# Altium footprint library IC.PcbLib: 68 footprints (part 2 of 5)
Each footprint in its own frame and in the unit in brackets; x right, y up, seen from the top. Pads: shape width x height; smd on the part's side, far side on the other; paste and mask are expansions set on the pad; w line width, h text height; cw(c..) or ccw(c..) is an arc to the next point about the centre after c.
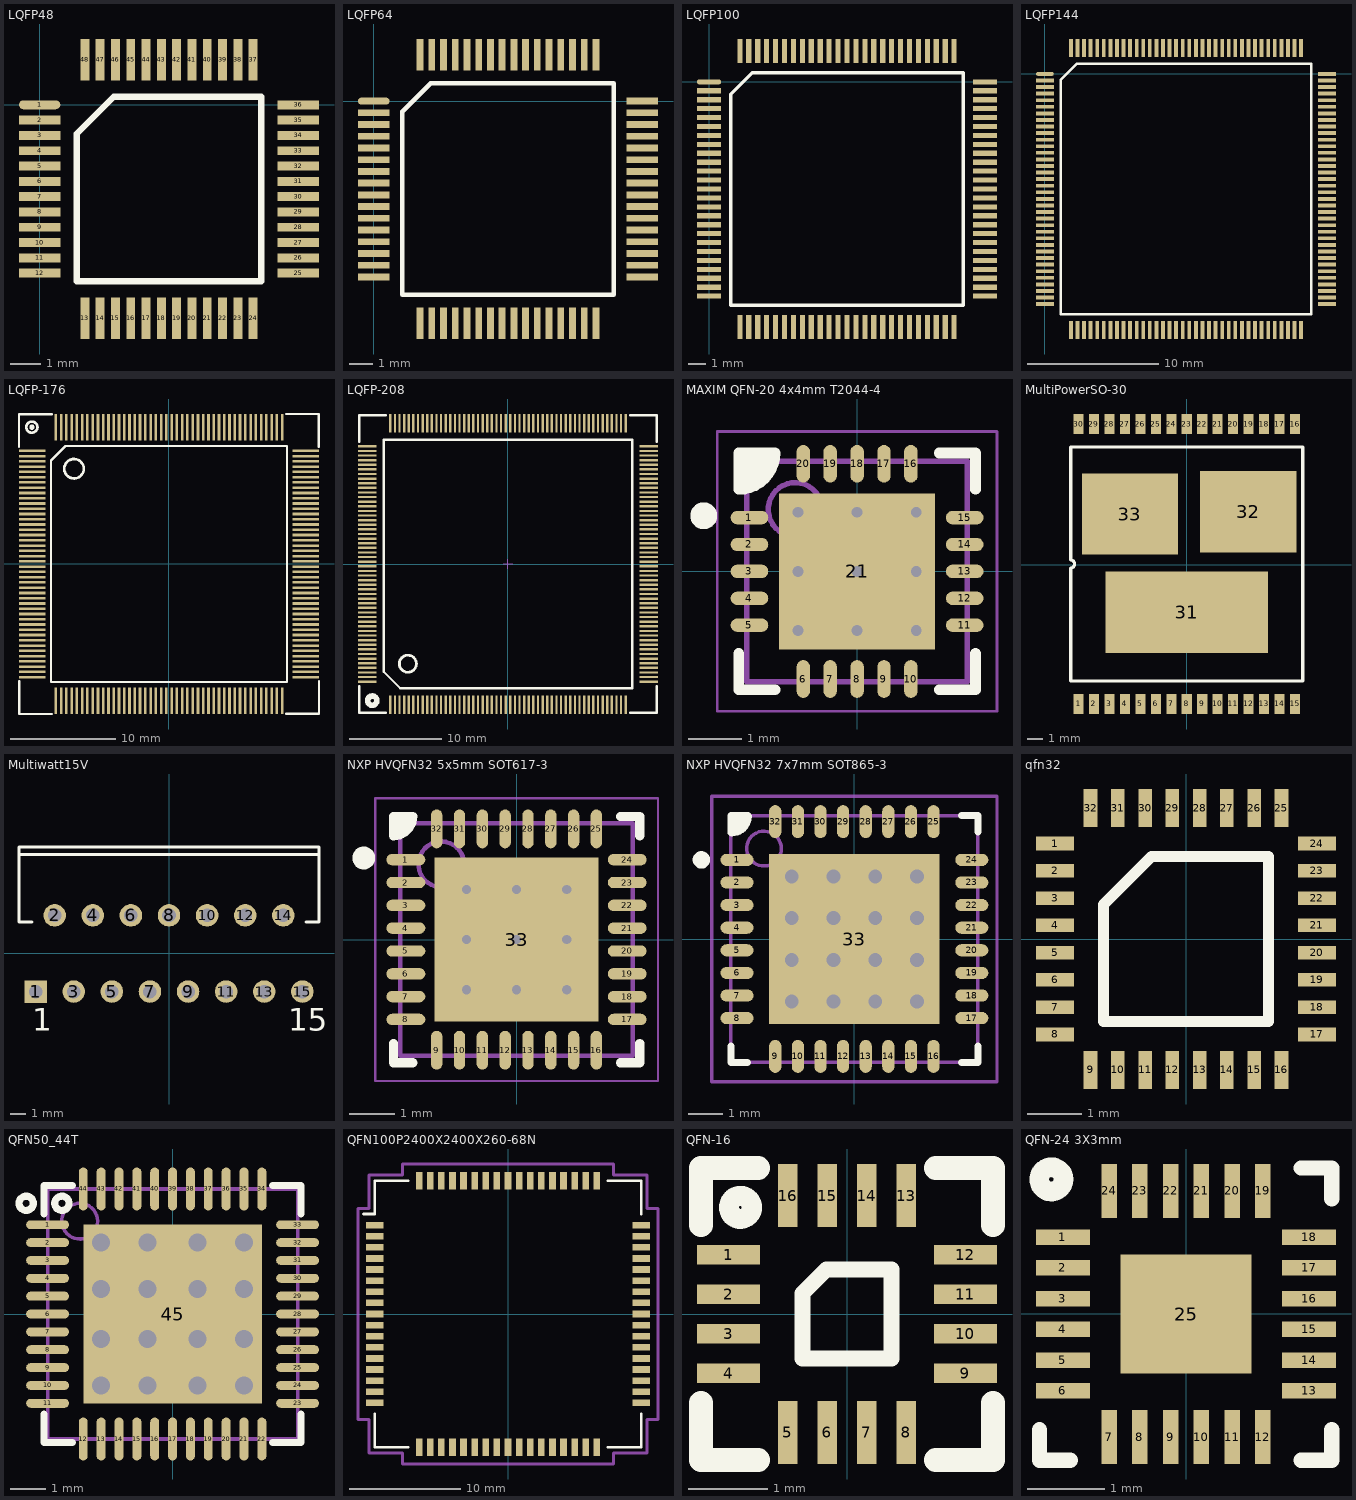
[diagram p1: the footprints below, top view; thin cyan lines are the x and y axes]

## LQFP48 [mm]
pads (48):
  oval 1.35x0.29 smd: 1(0,0)
  rect 1.35x0.29 smd: 2(0,-0.5) 3(0,-1) 4(0,-1.5) 5(0,-2) 6(0,-2.5) 7(0,-3) 8(0,-3.5) 9(0,-4) 10(0,-4.5) 11(0,-5) 12(0,-5.5) 25(8.45,-5.5) 26(8.45,-5) 27(8.45,-4.5) 28(8.45,-4) 29(8.45,-3.5) 30(8.45,-3) 31(8.45,-2.5) 32(8.45,-2) 33(8.45,-1.5) 34(8.45,-1) 35(8.45,-0.5) 36(8.45,0)
  rect 0.29x1.35 smd: 13(1.475,-6.975) 14(1.975,-6.975) 15(2.475,-6.975) 16(2.975,-6.975) 17(3.475,-6.975) 18(3.975,-6.975) 19(4.475,-6.975) 20(4.975,-6.975) 21(5.475,-6.975) 22(5.975,-6.975) 23(6.475,-6.975) 24(6.975,-6.975) 37(6.975,1.475) 38(6.475,1.475) 39(5.975,1.475) 40(5.475,1.475) 41(4.975,1.475) 42(4.475,1.475) 43(3.975,1.475) 44(3.475,1.475) 45(2.975,1.475) 46(2.475,1.475) 47(1.975,1.475) 48(1.475,1.475)
Top Overlay:
  lines w0.2: 1.21,-5.765 7.24,-5.765 7.24,0.265 2.42,0.265 1.21,-0.945 1.21,-5.765
3D body "User Library-LQFP48-2.STEP": height 1.62, standoff -0.01, extent -0.355,-7.34 8.788,1.803

## LQFP64 [mm]
pads (64):
  oval 1.35x0.29 smd: 1(0,0)
  rect 1.35x0.29 smd: 2(0,-0.5) 3(0,-1) 4(0,-1.5) 5(0,-2) 6(0,-2.5) 7(0,-3) 8(0,-3.5) 9(0,-4) 10(0,-4.5) 11(0,-5) 12(0,-5.5) 13(0,-6) 14(0,-6.5) 15(0,-7) 16(0,-7.5) 33(11.45,-7.5) 34(11.45,-7) 35(11.45,-6.5) 36(11.45,-6) 37(11.45,-5.5) 38(11.45,-5) 39(11.45,-4.5) 40(11.45,-4) 41(11.45,-3.5) 42(11.45,-3) 43(11.45,-2.5) 44(11.45,-2) 45(11.45,-1.5) 46(11.45,-1) 47(11.45,-0.5) 48(11.45,0)
  rect 0.29x1.35 smd: 17(1.975,-9.475) 18(2.475,-9.475) 19(2.975,-9.475) 20(3.475,-9.475) 21(3.975,-9.475) 22(4.475,-9.475) 23(4.975,-9.475) 24(5.475,-9.475) 25(5.975,-9.475) 26(6.475,-9.475) 27(6.975,-9.475) 28(7.475,-9.475) 29(7.975,-9.475) 30(8.475,-9.475) 31(8.975,-9.475) 32(9.475,-9.475) 49(9.475,1.975) 50(8.975,1.975) 51(8.475,1.975) 52(7.975,1.975) 53(7.475,1.975) 54(6.975,1.975) 55(6.475,1.975) 56(5.975,1.975) 57(5.475,1.975) 58(4.975,1.975) 59(4.475,1.975) 60(3.975,1.975) 61(3.475,1.975) 62(2.975,1.975) 63(2.475,1.975) 64(1.975,1.975)
Top Overlay:
  lines w0.2: 1.21,-8.265 10.24,-8.265 10.24,0.765 2.42,0.765 1.21,-0.445 1.21,-8.265
3D body "User Library-LQFP64-2.STEP": height 1.62, standoff -0.01, extent -0.357,-9.831 11.787,2.313

## LQFP100 [mm]
pads (100):
  oval 1.35x0.29 smd: 1(0,0)
  rect 1.35x0.29 smd: 2(0,-0.5) 3(0,-1) 4(0,-1.5) 5(0,-2) 6(0,-2.5) 7(0,-3) 8(0,-3.5) 9(0,-4) 10(0,-4.5) 11(0,-5) 12(0,-5.5) 13(0,-6) 14(0,-6.5) 15(0,-7) 16(0,-7.5) 17(0,-8) 18(0,-8.5) 19(0,-9) 20(0,-9.5) 21(0,-10) 22(0,-10.5) 23(0,-11) 24(0,-11.5) 25(0,-12) 51(15.45,-12) 52(15.45,-11.5) 53(15.45,-11) 54(15.45,-10.5) 55(15.45,-10) 56(15.45,-9.5) 57(15.45,-9) 58(15.45,-8.5) 59(15.45,-8) 60(15.45,-7.5) 61(15.45,-7) 62(15.45,-6.5) 63(15.45,-6) 64(15.45,-5.5) 65(15.45,-5) 66(15.45,-4.5) 67(15.45,-4) 68(15.45,-3.5) 69(15.45,-3) 70(15.45,-2.5) 71(15.45,-2) 72(15.45,-1.5) 73(15.45,-1) 74(15.45,-0.5) 75(15.45,0)
  rect 0.29x1.35 smd: 26(1.725,-13.725) 27(2.225,-13.725) 28(2.725,-13.725) 29(3.225,-13.725) 30(3.725,-13.725) 31(4.225,-13.725) 32(4.725,-13.725) 33(5.225,-13.725) 34(5.725,-13.725) 35(6.225,-13.725) 36(6.725,-13.725) 37(7.225,-13.725) 38(7.725,-13.725) 39(8.225,-13.725) 40(8.725,-13.725) 41(9.225,-13.725) 42(9.725,-13.725) 43(10.225,-13.725) 44(10.725,-13.725) 45(11.225,-13.725) 46(11.725,-13.725) 47(12.225,-13.725) 48(12.725,-13.725) 49(13.225,-13.725) 50(13.725,-13.725) 76(13.725,1.725) 77(13.225,1.725) 78(12.725,1.725) 79(12.225,1.725) 80(11.725,1.725) 81(11.225,1.725) 82(10.725,1.725) 83(10.225,1.725) 84(9.725,1.725) 85(9.225,1.725) 86(8.725,1.725) 87(8.225,1.725) 88(7.725,1.725) 89(7.225,1.725) 90(6.725,1.725) 91(6.225,1.725) 92(5.725,1.725) 93(5.225,1.725) 94(4.725,1.725) 95(4.225,1.725) 96(3.725,1.725) 97(3.225,1.725) 98(2.725,1.725) 99(2.225,1.725) 100(1.725,1.725)
Top Overlay:
  lines w0.2: 1.21,-12.515 1.21,-0.695 2.42,0.515 14.24,0.515 14.24,-12.515 1.21,-12.515
3D body "User Library-LQFP100-3.STEP": height 1.62, standoff -0.01, extent -0.345,-14.086 15.799,2.057

## LQFP144 [mm]
pads (144):
  oval 1.35x0.29 smd: 1(0,0)
  rect 1.35x0.29 smd: 2(0,-0.5) 3(0,-1) 4(0,-1.5) 5(0,-2) 6(0,-2.5) 7(0,-3) 8(0,-3.5) 9(0,-4) 10(0,-4.5) 11(0,-5) 12(0,-5.5) 13(0,-6) 14(0,-6.5) 15(0,-7) 16(0,-7.5) 17(0,-8) 18(0,-8.5) 19(0,-9) 20(0,-9.5) 21(0,-10) 22(0,-10.5) 23(0,-11) 24(0,-11.5) 25(0,-12) 26(0,-12.5) 27(0,-13) 28(0,-13.5) 29(0,-14) 30(0,-14.5) 31(0,-15) 32(0,-15.5) 33(0,-16) 34(0,-16.5) 35(0,-17) 36(0,-17.5) 73(21.45,-17.5) 74(21.45,-17) 75(21.45,-16.5) 76(21.45,-16) 77(21.45,-15.5) 78(21.45,-15) 79(21.45,-14.5) 80(21.45,-14) 81(21.45,-13.5) 82(21.45,-13) 83(21.45,-12.5) 84(21.45,-12) 85(21.45,-11.5) 86(21.45,-11) 87(21.45,-10.5) 88(21.45,-10) 89(21.45,-9.5) 90(21.45,-9) 91(21.45,-8.5) 92(21.45,-8) 93(21.45,-7.5) 94(21.45,-7) 95(21.45,-6.5) 96(21.45,-6) 97(21.45,-5.5) 98(21.45,-5) 99(21.45,-4.5) 100(21.45,-4) 101(21.45,-3.5) 102(21.45,-3) 103(21.45,-2.5) 104(21.45,-2) 105(21.45,-1.5) 106(21.45,-1) 107(21.45,-0.5) 108(21.45,0)
  rect 0.29x1.35 smd: 37(1.975,-19.475) 38(2.475,-19.475) 39(2.975,-19.475) 40(3.475,-19.475) 41(3.975,-19.475) 42(4.475,-19.475) 43(4.975,-19.475) 44(5.475,-19.475) 45(5.975,-19.475) 46(6.475,-19.475) 47(6.975,-19.475) 48(7.475,-19.475) 49(7.975,-19.475) 50(8.475,-19.475) 51(8.975,-19.475) 52(9.475,-19.475) 53(9.975,-19.475) 54(10.475,-19.475) 55(10.975,-19.475) 56(11.475,-19.475) 57(11.975,-19.475) 58(12.475,-19.475) 59(12.975,-19.475) 60(13.475,-19.475) 61(13.975,-19.475) 62(14.475,-19.475) 63(14.975,-19.475) 64(15.475,-19.475) 65(15.975,-19.475) 66(16.475,-19.475) 67(16.975,-19.475) 68(17.475,-19.475) 69(17.975,-19.475) 70(18.475,-19.475) 71(18.975,-19.475) 72(19.475,-19.475) 109(19.475,1.975) 110(18.975,1.975) 111(18.475,1.975) 112(17.975,1.975) 113(17.475,1.975) 114(16.975,1.975) 115(16.475,1.975) 116(15.975,1.975) 117(15.475,1.975) 118(14.975,1.975) 119(14.475,1.975) 120(13.975,1.975) 121(13.475,1.975) 122(12.975,1.975) 123(12.475,1.975) 124(11.975,1.975) 125(11.475,1.975) 126(10.975,1.975) 127(10.475,1.975) 128(9.975,1.975) 129(9.475,1.975) 130(8.975,1.975) 131(8.475,1.975) 132(7.975,1.975) 133(7.475,1.975) 134(6.975,1.975) 135(6.475,1.975) 136(5.975,1.975) 137(5.475,1.975) 138(4.975,1.975) 139(4.475,1.975) 140(3.975,1.975) 141(3.475,1.975) 142(2.975,1.975) 143(2.475,1.975) 144(1.975,1.975)
Top Overlay:
  lines w0.2: 1.21,-18.265 20.24,-18.265 20.24,0.765 2.42,0.765 1.21,-0.445 1.21,-18.265
3D body "User Library-LQFP144-3.STEP": height 1.8, standoff -0.09, extent -0.384,-19.84 21.819,2.362

## LQFP-176 [mm]
pads (176):
  rect 2.5x0.25 smd: 1(-13,10.75) 2(-13,10.25) 3(-13,9.75) 4(-13,9.25) 5(-13,8.75) 6(-13,8.25) 7(-13,7.75) 8(-13,7.25) 9(-13,6.75) 10(-13,6.25) 11(-13,5.75) 12(-13,5.25) 13(-13,4.75) 14(-13,4.25) 15(-13,3.75) 16(-13,3.25) 17(-13,2.75) 18(-13,2.25) 19(-13,1.75) 20(-13,1.25) 21(-13,0.75) 22(-13,0.25) 23(-13,-0.25) 24(-13,-0.75) 25(-13,-1.25) 26(-13,-1.75) 27(-13,-2.25) 28(-13,-2.75) 29(-13,-3.25) 30(-13,-3.75) 31(-13,-4.25) 32(-13,-4.75) 33(-13,-5.25) 34(-13,-5.75) 35(-13,-6.25) 36(-13,-6.75) 37(-13,-7.25) 38(-13,-7.75) 39(-13,-8.25) 40(-13,-8.75) 41(-13,-9.25) 42(-13,-9.75) 43(-13,-10.25) 44(-13,-10.75) 89(13,-10.75) 90(13,-10.25) 91(13,-9.75) 92(13,-9.25) 93(13,-8.75) 94(13,-8.25) 95(13,-7.75) 96(13,-7.25) 97(13,-6.75) 98(13,-6.25) 99(13,-5.75) 100(13,-5.25) 101(13,-4.75) 102(13,-4.25) 103(13,-3.75) 104(13,-3.25) 105(13,-2.75) 106(13,-2.25) 107(13,-1.75) 108(13,-1.25) 109(13,-0.75) 110(13,-0.25) 111(13,0.25) 112(13,0.75) 113(13,1.25) 114(13,1.75) 115(13,2.25) 116(13,2.75) 117(13,3.25) 118(13,3.75) 119(13,4.25) 120(13,4.75) 121(13,5.25) 122(13,5.75) 123(13,6.25) 124(13,6.75) 125(13,7.25) 126(13,7.75) 127(13,8.25) 128(13,8.75) 129(13,9.25) 130(13,9.75) 131(13,10.25) 132(13,10.75)
  rect 0.25x2.5 smd: 45(-10.75,-13) 46(-10.25,-13) 47(-9.75,-13) 48(-9.25,-13) 49(-8.75,-13) 50(-8.25,-13) 51(-7.75,-13) 52(-7.25,-13) 53(-6.75,-13) 54(-6.25,-13) 55(-5.75,-13) 56(-5.25,-13) 57(-4.75,-13) 58(-4.25,-13) 59(-3.75,-13) 60(-3.25,-13) 61(-2.75,-13) 62(-2.25,-13) 63(-1.75,-13) 64(-1.25,-13) 65(-0.75,-13) 66(-0.25,-13) 67(0.25,-13) 68(0.75,-13) 69(1.25,-13) 70(1.75,-13) 71(2.25,-13) 72(2.75,-13) 73(3.25,-13) 74(3.75,-13) 75(4.25,-13) 76(4.75,-13) 77(5.25,-13) 78(5.75,-13) 79(6.25,-13) 80(6.75,-13) 81(7.25,-13) 82(7.75,-13) 83(8.25,-13) 84(8.75,-13) 85(9.25,-13) 86(9.75,-13) 87(10.25,-13) 88(10.75,-13) 133(10.75,13) 134(10.25,13) 135(9.75,13) 136(9.25,13) 137(8.75,13) 138(8.25,13) 139(7.75,13) 140(7.25,13) 141(6.75,13) 142(6.25,13) 143(5.75,13) 144(5.25,13) 145(4.75,13) 146(4.25,13) 147(3.75,13) 148(3.25,13) 149(2.75,13) 150(2.25,13) 151(1.75,13) 152(1.25,13) 153(0.75,13) 154(0.25,13) 155(-0.25,13) 156(-0.75,13) 157(-1.25,13) 158(-1.75,13) 159(-2.25,13) 160(-2.75,13) 161(-3.25,13) 162(-3.75,13) 163(-4.25,13) 164(-4.75,13) 165(-5.25,13) 166(-5.75,13) 167(-6.25,13) 168(-6.75,13) 169(-7.25,13) 170(-7.75,13) 171(-8.25,13) 172(-8.75,13) 173(-9.25,13) 174(-9.75,13) 175(-10.25,13) 176(-10.75,13)
Top Overlay:
  circle w0.254: c-13.025,13 r0.527
  circle w0.25: c-13.025,13 r0.125
  circle w0.254: c-9.025,9.05 r0.925
  lines w0.2: -14.25,11.125 -14.25,14.225 -11.125,14.225 ; -14.225,-11.125 -14.225,-14.25 -11.125,-14.25 ; 11.125,-14.225 14.25,-14.225 14.25,-11.125 ; 11.125,14.25 14.225,14.25 14.225,11.125 ; -11.215,-11.215 -11.215,9.835 -9.835,11.215 11.215,11.215 11.215,-11.215 -11.215,-11.215
3D body "User Library-LQFP176-0_5.STEP": height 1.55, standoff -0.02, extent -12.886,-12.886 12.886,12.886

## LQFP-208 [mm]
pads (208):
  rect 0.25x2 smd mask+0.05: 1(-12.75,-15.25) 2(-12.25,-15.25) 3(-11.75,-15.25) 4(-11.25,-15.25) 5(-10.75,-15.25) 6(-10.25,-15.25) 7(-9.75,-15.25) 8(-9.25,-15.25) 9(-8.75,-15.25) 10(-8.25,-15.25) 11(-7.75,-15.25) 12(-7.25,-15.25) 13(-6.75,-15.25) 14(-6.25,-15.25) 15(-5.75,-15.25) 16(-5.25,-15.25) 17(-4.75,-15.25) 18(-4.25,-15.25) 19(-3.75,-15.25) 20(-3.25,-15.25) 21(-2.75,-15.25) 22(-2.25,-15.25) 23(-1.75,-15.25) 24(-1.25,-15.25) 25(-0.75,-15.25) 26(-0.25,-15.25) 27(0.25,-15.25) 28(0.75,-15.25) 29(1.25,-15.25) 30(1.75,-15.25) 31(2.25,-15.25) 32(2.75,-15.25) 33(3.25,-15.25) 34(3.75,-15.25) 35(4.25,-15.25) 36(4.75,-15.25) 37(5.25,-15.25) 38(5.75,-15.25) 39(6.25,-15.25) 40(6.75,-15.25) 41(7.25,-15.25) 42(7.75,-15.25) 43(8.25,-15.25) 44(8.75,-15.25) 45(9.25,-15.25) 46(9.75,-15.25) 47(10.25,-15.25) 48(10.75,-15.25) 49(11.25,-15.25) 50(11.75,-15.25) 51(12.25,-15.25) 52(12.75,-15.25) 105(12.75,15.25) 106(12.25,15.25) 107(11.75,15.25) 108(11.25,15.25) 109(10.75,15.25) 110(10.25,15.25) 111(9.75,15.25) 112(9.25,15.25) 113(8.75,15.25) 114(8.25,15.25) 115(7.75,15.25) 116(7.25,15.25) 117(6.75,15.25) 118(6.25,15.25) 119(5.75,15.25) 120(5.25,15.25) 121(4.75,15.25) 122(4.25,15.25) 123(3.75,15.25) 124(3.25,15.25) 125(2.75,15.25) 126(2.25,15.25) 127(1.75,15.25) 128(1.25,15.25) 129(0.75,15.25) 130(0.25,15.25) 131(-0.25,15.25) 132(-0.75,15.25) 133(-1.25,15.25) 134(-1.75,15.25) 135(-2.25,15.25) 136(-2.75,15.25) 137(-3.25,15.25) 138(-3.75,15.25) 139(-4.25,15.25) 140(-4.75,15.25) 141(-5.25,15.25) 142(-5.75,15.25) 143(-6.25,15.25) 144(-6.75,15.25) 145(-7.25,15.25) 146(-7.75,15.25) 147(-8.25,15.25) 148(-8.75,15.25) 149(-9.25,15.25) 150(-9.75,15.25) 151(-10.25,15.25) 152(-10.75,15.25) 153(-11.25,15.25) 154(-11.75,15.25) 155(-12.25,15.25) 156(-12.75,15.25)
  rect 2x0.25 smd mask+0.05: 53(15.25,-12.75) 54(15.25,-12.25) 55(15.25,-11.75) 56(15.25,-11.25) 57(15.25,-10.75) 58(15.25,-10.25) 59(15.25,-9.75) 60(15.25,-9.25) 61(15.25,-8.75) 62(15.25,-8.25) 63(15.25,-7.75) 64(15.25,-7.25) 65(15.25,-6.75) 66(15.25,-6.25) 67(15.25,-5.75) 68(15.25,-5.25) 69(15.25,-4.75) 70(15.25,-4.25) 71(15.25,-3.75) 72(15.25,-3.25) 73(15.25,-2.75) 74(15.25,-2.25) 75(15.25,-1.75) 76(15.25,-1.25) 77(15.25,-0.75) 78(15.25,-0.25) 79(15.25,0.25) 80(15.25,0.75) 81(15.25,1.25) 82(15.25,1.75) 83(15.25,2.25) 84(15.25,2.75) 85(15.25,3.25) 86(15.25,3.75) 87(15.25,4.25) 88(15.25,4.75) 89(15.25,5.25) 90(15.25,5.75) 91(15.25,6.25) 92(15.25,6.75) 93(15.25,7.25) 94(15.25,7.75) 95(15.25,8.25) 96(15.25,8.75) 97(15.25,9.25) 98(15.25,9.75) 99(15.25,10.25) 100(15.25,10.75) 101(15.25,11.25) 102(15.25,11.75) 103(15.25,12.25) 104(15.25,12.75) 157(-15.25,12.75) 158(-15.25,12.25) 159(-15.25,11.75) 160(-15.25,11.25) 161(-15.25,10.75) 162(-15.25,10.25) 163(-15.25,9.75) 164(-15.25,9.25) 165(-15.25,8.75) 166(-15.25,8.25) 167(-15.25,7.75) 168(-15.25,7.25) 169(-15.25,6.75) 170(-15.25,6.25) 171(-15.25,5.75) 172(-15.25,5.25) 173(-15.25,4.75) 174(-15.25,4.25) 175(-15.25,3.75) 176(-15.25,3.25) 177(-15.25,2.75) 178(-15.25,2.25) 179(-15.25,1.75) 180(-15.25,1.25) 181(-15.25,0.75) 182(-15.25,0.25) 183(-15.25,-0.25) 184(-15.25,-0.75) 185(-15.25,-1.25) 186(-15.25,-1.75) 187(-15.25,-2.25) 188(-15.25,-2.75) 189(-15.25,-3.25) 190(-15.25,-3.75) 191(-15.25,-4.25) 192(-15.25,-4.75) 193(-15.25,-5.25) 194(-15.25,-5.75) 195(-15.25,-6.25) 196(-15.25,-6.75) 197(-15.25,-7.25) 198(-15.25,-7.75) 199(-15.25,-8.25) 200(-15.25,-8.75) 201(-15.25,-9.25) 202(-15.25,-9.75) 203(-15.25,-10.25) 204(-15.25,-10.75) 205(-15.25,-11.25) 206(-15.25,-11.75) 207(-15.25,-12.25) 208(-15.25,-12.75)
Top Overlay:
  circle w0.6: c-14.7,-14.8 r0.5
  circle w0.3: c-10.845,-10.805 r0.925
  lines w0.25: -16.1,-13.225 -16.1,-16.1 -13.225,-16.1 ; -16.1,13.225 -16.1,16.1 -13.225,16.1 ; 13.225,-16.1 16.1,-16.1 16.1,-13.225 ; 13.225,16.1 16.1,16.1 16.1,13.225 ; -13.465,-11.68 -13.465,13.465 13.465,13.465 13.465,-13.465 -11.68,-13.465 -13.465,-11.68
Mechanical 15:
  lines w0.1: -0.5,0.002 0.5,0.002 ; 0,-0.498 0,0.502
3D body "User Library-LQFP-208.STEP": height 1.4, standoff 0, extent -14.75,-14.775 14.75,14.725

## MAXIM QFN-20 4x4mm T2044-4 [mm] "TQFN, 20-Leads, Body 4.00x4.00mm, Pitch 0.50mm, Thermal Pad 2.90x2.90mm, IPC Medium Density"
height 0.8
pads (21):
  oval 0.7x0.25 smd: 1(-2,1) 2(-2,0.5) 3(-2,0) 4(-2,-0.5) 5(-2,-1) 11(2,-1) 12(2,-0.5) 13(2,0) 14(2,0.5) 15(2,1)
  oval 0.25x0.7 smd: 6(-1,-2) 7(-0.5,-2) 8(0,-2) 9(0.5,-2) 10(1,-2) 16(1,2) 17(0.5,2) 18(0,2) 19(-0.5,2) 20(-1,2)
  rect 2.9x2.9 smd: 21(0,0)
via 1.1,-1.1 diameter 0.5 hole 0.2
via 0,-1.1 diameter 0.5 hole 0.2
via -1.1,-1.1 diameter 0.5 hole 0.2
via 1.1,0 diameter 0.5 hole 0.2
via 0,0 diameter 0.5 hole 0.2
via -1.1,0 diameter 0.5 hole 0.2
via 1.1,1.1 diameter 0.5 hole 0.2
via 0,1.1 diameter 0.5 hole 0.2
via -1.1,1.1 diameter 0.5 hole 0.2
Top Overlay:
  circle w0.25: c-2.85,1.034 r0.125
  region: -2.159,2.2 -1.525,2.2 -1.525,1.904 -1.904,1.525 -2.2,1.525
  lines w0.2: -2.2,-1.525 -2.2,-2.2 -1.525,-2.2 ; 1.525,-2.2 2.2,-2.2 2.2,-1.525 ; 1.525,2.2 2.2,2.2 2.2,1.525 ; -2.2,1.525 ccw(c-2.2,2.2) -1.525,2.2 -2.2,2.2 -2.2,1.525
Mechanical 13:
  circle w0.1: c-1.15,1.15 r0.5
  lines w0.1: -2.05,-2.05 2.05,-2.05 2.05,2.05 -2.05,2.05 -2.05,-2.05
Mechanical 15:
  lines w0.05: -2.6,-2.6 2.6,-2.6 2.6,2.6 -2.6,2.6 -2.6,-2.6
  lines w0.1: -0.5,0 0.5,0 ; 0,-0.5 0,0.5
3D body: height 0.8, standoff 0.01, extent -2.05,-2.05 2.05,2.05

## MultiPowerSO-30 [mm]
pads (33):
  rect 0.65x1.3 smd: 1(-7,-9) 2(-6,-9) 3(-5,-9) 4(-4,-9) 5(-3,-9) 6(-2,-9) 7(-1,-9) 8(0,-9) 9(1,-9) 10(2,-9) 11(3,-9) 12(4,-9) 13(5,-9) 14(6,-9) 15(7,-9) 16(7,9.1) 17(6,9.1) 18(5,9.1) 19(4,9.1) 20(3,9.1) 21(2,9.1) 22(1,9.1) 23(0,9.1) 24(-1,9.1) 25(-2,9.1) 26(-3,9.1) 27(-4,9.1) 28(-5,9.1) 29(-6,9.1) 30(-7,9.1)
  rect 10.5x5.25 smd: 31(0,-3.075)
  rect 6.23x5.25 smd: 32(3.975,3.425) 33(-3.675,3.275)
Top Overlay:
  lines w0.2: -7.5,-7.515 7.5,-7.515 7.5,7.615 -7.5,7.615 -7.5,0.3 cw(c-7.5,0.05) -7.5,-0.2 -7.5,-7.515
3D body "SW3dPS-PowSO30.STEP": height 2.37, standoff -0.09, extent -8.6,-9.5 8.6,9.5

## Multiwatt15V [mm] "TO, Thru-Hole, Vertical, Heatsink Mounted; 15 Bent Staggered Leads; Pitch 1.27 mm"
height 21
pads (15):
  rect 1.5x1.5 hole 0.9: 1(-8.89,-2.54)
  round 1.5 hole 0.9: 2(-7.62,2.54) 3(-6.35,-2.54) 4(-5.08,2.54) 5(-3.81,-2.54) 6(-2.54,2.54) 7(-1.27,-2.54) 8(0,2.54) 9(1.27,-2.54) 10(2.54,2.54) 11(3.81,-2.54) 12(5.08,2.54) 13(6.35,-2.54) 14(7.62,2.54) 15(8.89,-2.54)
Top Overlay:
  lines w0.2: -10,6.59 10,6.59 ; -9.144,2.09 -10,2.09 -10,7.09 10,7.09 10,2.09 9.144,2.09
  text "15" at 7.94,-5.165 h1.5
  text "1" at -9.12,-5.165 h1.5
3D body "User Library-Multiwatt15V.step": height 21.3, standoff -1, extent -9.8,-2.8 9.8,7.09

## NXP HVQFN32 5x5mm SOT617-3 [mm] "HVQFN, 32-Leads, Body 5.00x5.00mm, Pitch 0.50mm, Thermal Pad 3.60x3.60mm, IPC Medium Density"
height 0.85
pads (33):
  oval 0.85x0.25 smd: 1(-2.425,1.75) 2(-2.425,1.25) 3(-2.425,0.75) 4(-2.425,0.25) 5(-2.425,-0.25) 6(-2.425,-0.75) 7(-2.425,-1.25) 8(-2.425,-1.75) 17(2.425,-1.75) 18(2.425,-1.25) 19(2.425,-0.75) 20(2.425,-0.25) 21(2.425,0.25) 22(2.425,0.75) 23(2.425,1.25) 24(2.425,1.75)
  oval 0.25x0.85 smd: 9(-1.75,-2.425) 10(-1.25,-2.425) 11(-0.75,-2.425) 12(-0.25,-2.425) 13(0.25,-2.425) 14(0.75,-2.425) 15(1.25,-2.425) 16(1.75,-2.425) 25(1.75,2.425) 26(1.25,2.425) 27(0.75,2.425) 28(0.25,2.425) 29(-0.25,2.425) 30(-0.75,2.425) 31(-1.25,2.425) 32(-1.75,2.425)
  rect 3.6x3.6 smd: 33(0,0)
via 1.1,-1.1 diameter 0.5 hole 0.2
via 0,-1.1 diameter 0.5 hole 0.2
via -1.1,-1.1 diameter 0.5 hole 0.2
via 1.1,0 diameter 0.5 hole 0.2
via 0,0 diameter 0.5 hole 0.2
via -1.1,0 diameter 0.5 hole 0.2
via 1.1,1.1 diameter 0.5 hole 0.2
via 0,1.1 diameter 0.5 hole 0.2
via -1.1,1.1 diameter 0.5 hole 0.2
Top Overlay:
  circle w0.25: c-3.35,1.788 r0.125
  region: -2.7,2.7 -2.275,2.7 -2.275,2.551 -2.551,2.275 -2.7,2.275
  lines w0.2: -2.7,-2.275 -2.7,-2.7 -2.275,-2.7 ; 2.275,-2.7 2.7,-2.7 2.7,-2.275 ; 2.275,2.7 2.7,2.7 2.7,2.275 ; -2.7,2.275 ccw(c-2.7,2.7) -2.275,2.7 -2.7,2.7 -2.7,2.275
Mechanical 13:
  circle w0.1: c-1.65,1.65 r0.5
  lines w0.1: -2.55,-2.55 2.55,-2.55 2.55,2.55 -2.55,2.55 -2.55,-2.55
Mechanical 15:
  lines w0.05: -3.1,-3.1 3.1,-3.1 3.1,3.1 -3.1,3.1 -3.1,-3.1
  lines w0.1: -0.5,0 0.5,0 ; 0,-0.5 0,0.5
3D body: height 0.85, standoff 0, extent -2.55,-2.55 2.55,2.55

## NXP HVQFN32 7x7mm SOT865-3 [mm] "QFN, 32-Leads, Body 7.1x7.1mm (max), Pitch 0.65mm, IPC Medium Density"
height 1
pads (33):
  oval 0.95x0.35 smd: 1(-3.375,2.275) 2(-3.375,1.625) 3(-3.375,0.975) 4(-3.375,0.325) 5(-3.375,-0.325) 6(-3.375,-0.975) 7(-3.375,-1.625) 8(-3.375,-2.275) 17(3.375,-2.275) 18(3.375,-1.625) 19(3.375,-0.975) 20(3.375,-0.325) 21(3.375,0.325) 22(3.375,0.975) 23(3.375,1.625) 24(3.375,2.275)
  oval 0.35x0.95 smd: 9(-2.275,-3.375) 10(-1.625,-3.375) 11(-0.975,-3.375) 12(-0.325,-3.375) 13(0.325,-3.375) 14(0.975,-3.375) 15(1.625,-3.375) 16(2.275,-3.375) 25(2.275,3.375) 26(1.625,3.375) 27(0.975,3.375) 28(0.325,3.375) 29(-0.325,3.375) 30(-0.975,3.375) 31(-1.625,3.375) 32(-2.275,3.375)
  rect 4.9x4.9 smd: 33(0,0)
via 1.8,-1.8 diameter 0.8 hole 0.4
via 0.6,-1.8 diameter 0.8 hole 0.4
via -0.6,-1.8 diameter 0.8 hole 0.4
via -1.8,-1.8 diameter 0.8 hole 0.4
via 1.8,-0.6 diameter 0.8 hole 0.4
via 0.6,-0.6 diameter 0.8 hole 0.4
via -0.6,-0.6 diameter 0.8 hole 0.4
via -1.8,-0.6 diameter 0.8 hole 0.4
via 1.8,0.6 diameter 0.8 hole 0.4
via 0.6,0.6 diameter 0.8 hole 0.4
via -0.6,0.6 diameter 0.8 hole 0.4
via -1.8,0.6 diameter 0.8 hole 0.4
via 1.8,1.8 diameter 0.8 hole 0.4
via 0.6,1.8 diameter 0.8 hole 0.4
via -0.6,1.8 diameter 0.8 hole 0.4
via -1.8,1.8 diameter 0.8 hole 0.4
Top Overlay:
  circle w0.25: c-4.4,2.275 r0.125
  rectangle: -3.302,3.175 -3.175,3.302
  rectangle: -3.302,3.302 -3.048,3.55
  rectangle: -3.55,3.048 -3.302,3.55
  lines w0.2: -3.55,-3.075 -3.55,-3.55 -3.075,-3.55 ; 3.075,-3.55 3.55,-3.55 3.55,-3.075 ; 3.075,3.55 3.55,3.55 3.55,3.075 ; -3.55,3.075 ccw(c-3.525,3.075) -3.525,3.05 ccw(c-3.525,3.525) -3.05,3.525 ccw(c-3.075,3.525) -3.075,3.55 -3.55,3.55 -3.55,3.075
Mechanical 13:
  circle w0.1: c-2.6,2.6 r0.5
  lines w0.1: -3.55,-3.55 3.55,-3.55 3.55,3.55 -3.55,3.55 -3.55,-3.55
Mechanical 15:
  lines w0.1: -0.5,0 0.5,0 ; 0,-0.5 0,0.5 ; -4.1,-4.1 4.1,-4.1 4.1,4.1 -4.1,4.1 -4.1,-4.1
3D body: height 1, standoff 0, extent -3.55,-3.55 3.55,3.55

## qfn32 [mm]
pads (32):
  rect 0.7x0.25 smd: 1(-2.4,1.75) 2(-2.4,1.25) 3(-2.4,0.75) 4(-2.4,0.25) 5(-2.4,-0.25) 6(-2.4,-0.75) 7(-2.4,-1.25) 8(-2.4,-1.75) 17(2.4,-1.75) 18(2.4,-1.25) 19(2.4,-0.75) 20(2.4,-0.25) 21(2.4,0.25) 22(2.4,0.75) 23(2.4,1.25) 24(2.4,1.75)
  rect 0.25x0.7 smd: 9(-1.75,-2.4) 10(-1.25,-2.4) 11(-0.75,-2.4) 12(-0.25,-2.4) 13(0.25,-2.4) 14(0.75,-2.4) 15(1.25,-2.4) 16(1.75,-2.4) 25(1.75,2.4) 26(1.25,2.4) 27(0.75,2.4) 28(0.25,2.4) 29(-0.25,2.4) 30(-0.75,2.4) 31(-1.25,2.4) 32(-1.75,2.4)
Top Overlay:
  lines w0.2: -1.515,-1.515 1.515,-1.515 1.515,1.515 -0.63,1.515 -1.515,0.63 -1.515,-1.515
3D body "User Library-QFN-32-5x5 - EQ.step": height 0.85, standoff 0, extent -2.487,-2.477 2.513,2.523

## QFN50_44T [mm] "QFN-44, 44ML, pitch:0.5mm, 7x7x1mm"
height 1
pads (45):
  oval 1.2x0.25 smd mask+0.05: 1(-3.5,2.5) 2(-3.5,2) 3(-3.5,1.5) 4(-3.5,1) 5(-3.5,0.5) 6(-3.5,0) 7(-3.5,-0.5) 8(-3.5,-1) 9(-3.5,-1.5) 10(-3.5,-2) 11(-3.5,-2.5) 23(3.5,-2.5) 24(3.5,-2) 25(3.5,-1.5) 26(3.5,-1) 27(3.5,-0.5) 28(3.5,0) 29(3.5,0.5) 30(3.5,1) 31(3.5,1.5) 32(3.5,2) 33(3.5,2.5)
  oval 0.25x1.2 smd mask+0.05: 12(-2.5,-3.5) 13(-2,-3.5) 14(-1.5,-3.5) 15(-1,-3.5) 16(-0.5,-3.5) 17(0,-3.5) 18(0.5,-3.5) 19(1,-3.5) 20(1.5,-3.5) 21(2,-3.5) 22(2.5,-3.5) 34(2.5,3.5) 35(2,3.5) 36(1.5,3.5) 37(1,3.5) 38(0.5,3.5) 39(0,3.5) 40(-0.5,3.5) 41(-1,3.5) 42(-1.5,3.5) 43(-2,3.5) 44(-2.5,3.5)
  rect 5x5 smd: 45(0,0)
via -2,2 diameter 0.8 hole 0.5
via -0.7,2 diameter 0.8 hole 0.5
via 0.7,2 diameter 0.8 hole 0.5
via 2,2 diameter 0.8 hole 0.5
via -2,0.7 diameter 0.8 hole 0.5
via -0.7,0.7 diameter 0.8 hole 0.5
via 0.7,0.7 diameter 0.8 hole 0.5
via 2,0.7 diameter 0.8 hole 0.5
via 2,-0.7 diameter 0.8 hole 0.5
via 0.7,-0.7 diameter 0.8 hole 0.5
via -0.7,-0.7 diameter 0.8 hole 0.5
via -2,-0.7 diameter 0.8 hole 0.5
via 2,-2 diameter 0.8 hole 0.5
via 0.7,-2 diameter 0.8 hole 0.5
via -0.7,-2 diameter 0.8 hole 0.5
via -2,-2 diameter 0.8 hole 0.5
Top Overlay:
  circle w0.2: c-4.1,3.1 r0.2
  circle w0.2: c-3.1,3.1 r0.2
  lines w0.2: -3.6,-2.8 -3.6,-3.6 -2.8,-3.6 ; -3.6,2.8 -3.6,3.6 -2.8,3.6 ; 2.8,-3.6 3.6,-3.6 3.6,-2.8 ; 2.8,3.6 3.6,3.6 3.6,2.8
Mechanical 13:
  circle w0.1: c-2.6,2.6 r0.5
  lines w0.1: -3.5,-3.5 -3.5,3.5 3.5,3.5 3.5,-3.5 -3.5,-3.5
3D body "QFN50_44T.step": height 1, standoff 0, extent -3.501,-3.501 3.501,3.501

## QFN100P2400X2400X260-68N [mm]
pads (68):
  rect 1.6x0.6 smd paste-25.4 mask-25.4: 1(-12,8) 2(-12,7) 3(-12,6) 4(-12,5) 5(-12,4) 6(-12,3) 7(-12,2) 8(-12,1) 9(-12,0) 10(-12,-1) 11(-12,-2) 12(-12,-3) 13(-12,-4) 14(-12,-5) 15(-12,-6) 16(-12,-7) 17(-12,-8) 35(12,-8) 36(12,-7) 37(12,-6) 38(12,-5) 39(12,-4) 40(12,-3) 41(12,-2) 42(12,-1) 43(12,0) 44(12,1) 45(12,2) 46(12,3) 47(12,4) 48(12,5) 49(12,6) 50(12,7) 51(12,8)
  rect 0.6x1.6 smd paste-25.4 mask-25.4: 18(-8,-12) 19(-7,-12) 20(-6,-12) 21(-5,-12) 22(-4,-12) 23(-3,-12) 24(-2,-12) 25(-1,-12) 26(0,-12) 27(1,-12) 28(2,-12) 29(3,-12) 30(4,-12) 31(5,-12) 32(6,-12) 33(7,-12) 34(8,-12) 52(8,12) 53(7,12) 54(6,12) 55(5,12) 56(4,12) 57(3,12) 58(2,12) 59(1,12) 60(0,12) 61(-1,12) 62(-2,12) 63(-3,12) 64(-4,12) 65(-5,12) 66(-6,12) 67(-7,12) 68(-8,12)
Top Overlay:
  lines w0.254: -13,9 -12,9 -12,12 -9,12 ; -12,-9 -12,-12 -9,-12 ; 9,-12 12,-12 12,-9 ; 9,12 12,12 12,9
Top Paste:
  drawing of 68 lines, arcs and shapes, not listed
Top Solder:
  drawing of 68 lines, arcs and shapes, not listed
Mechanical 1:
  lines w0.254: -13.5,-9.5 -12.5,-9.5 -12.5,-12.5 -9.5,-12.5 -9.5,-13.5 9.5,-13.5 9.5,-12.5 12.5,-12.5 12.5,-9.5 13.5,-9.5 13.5,9.5 12.5,9.5 12.5,12.5 9.5,12.5 9.5,13.5 -9.5,13.5 -9.5,12.5 -12.5,12.5 -12.5,9.5 -13.5,9.5 -13.5,-9.5

## QFN-16 [mm]
pads (16):
  rect 0.8x0.25 smd: 1(-1.5,0.75) 2(-1.5,0.25) 3(-1.5,-0.25) 4(-1.5,-0.75) 9(1.5,-0.75) 10(1.5,-0.25) 11(1.5,0.25) 12(1.5,0.75)
  rect 0.25x0.8 smd: 5(-0.75,-1.5) 6(-0.25,-1.5) 7(0.25,-1.5) 8(0.75,-1.5) 13(0.75,1.5) 14(0.25,1.5) 15(-0.25,1.5) 16(-0.75,1.5)
Top Overlay:
  circle w0.254: c-1.35,1.35 r0.146
  lines w0.2: -0.565,-0.565 -0.565,0.26 -0.26,0.565 0.565,0.565 0.565,-0.565 -0.565,-0.565
  lines w0.3: -1.85,-1.125 -1.85,-1.85 -1.125,-1.85 ; -1.85,1.125 -1.85,1.85 -1.125,1.85 ; 1.125,-1.85 1.85,-1.85 1.85,-1.125 ; 1.125,1.85 1.85,1.85 1.85,1.125
3D body: height 1, standoff 0, extent -1.5,-1.5 1.5,1.5

## QFN-24 3X3mm [mm]
pads (25):
  rect 0.7x0.2 smd mask+0.03: 1(-1.6,1) 2(-1.6,0.6) 3(-1.6,0.2) 4(-1.6,-0.2) 5(-1.6,-0.6) 6(-1.6,-1) 13(1.6,-1) 14(1.6,-0.6) 15(1.6,-0.2) 16(1.6,0.2) 17(1.6,0.6) 18(1.6,1)
  rect 0.2x0.7 smd mask+0.03: 7(-1,-1.6) 8(-0.6,-1.6) 9(-0.2,-1.6) 10(0.2,-1.6) 11(0.6,-1.6) 12(1,-1.6) 19(1,1.6) 20(0.6,1.6) 21(0.2,1.6) 22(-0.2,1.6) 23(-0.6,1.6) 24(-1,1.6)
  rect 1.7x1.55 smd mask+0.03: 25(0,0)
Top Overlay:
  circle w0.254: c-1.75,1.75 r0.158
  lines w0.2: -1.906,-1.503 -1.906,-1.903 -1.506,-1.903 ; 1.495,-1.903 1.895,-1.903 1.895,-1.503 ; 1.495,1.897 1.895,1.897 1.895,1.497
3D body "User Library-MPU9250.STEP": height 1, standoff -0.05, extent -1.51,-1.51 1.51,1.51